# Altium footprint library ICs And Semiconductors SMD.PcbLib: 602 footprints (part 10 of 38)
Each footprint in its own frame and in the unit in brackets; x right, y up, seen from the top. Pads: shape width x height; smd on the part's side, far side on the other; paste and mask are expansions set on the pad; w line width, h text height; cw(c..) or ccw(c..) is an arc to the next point about the centre after c.
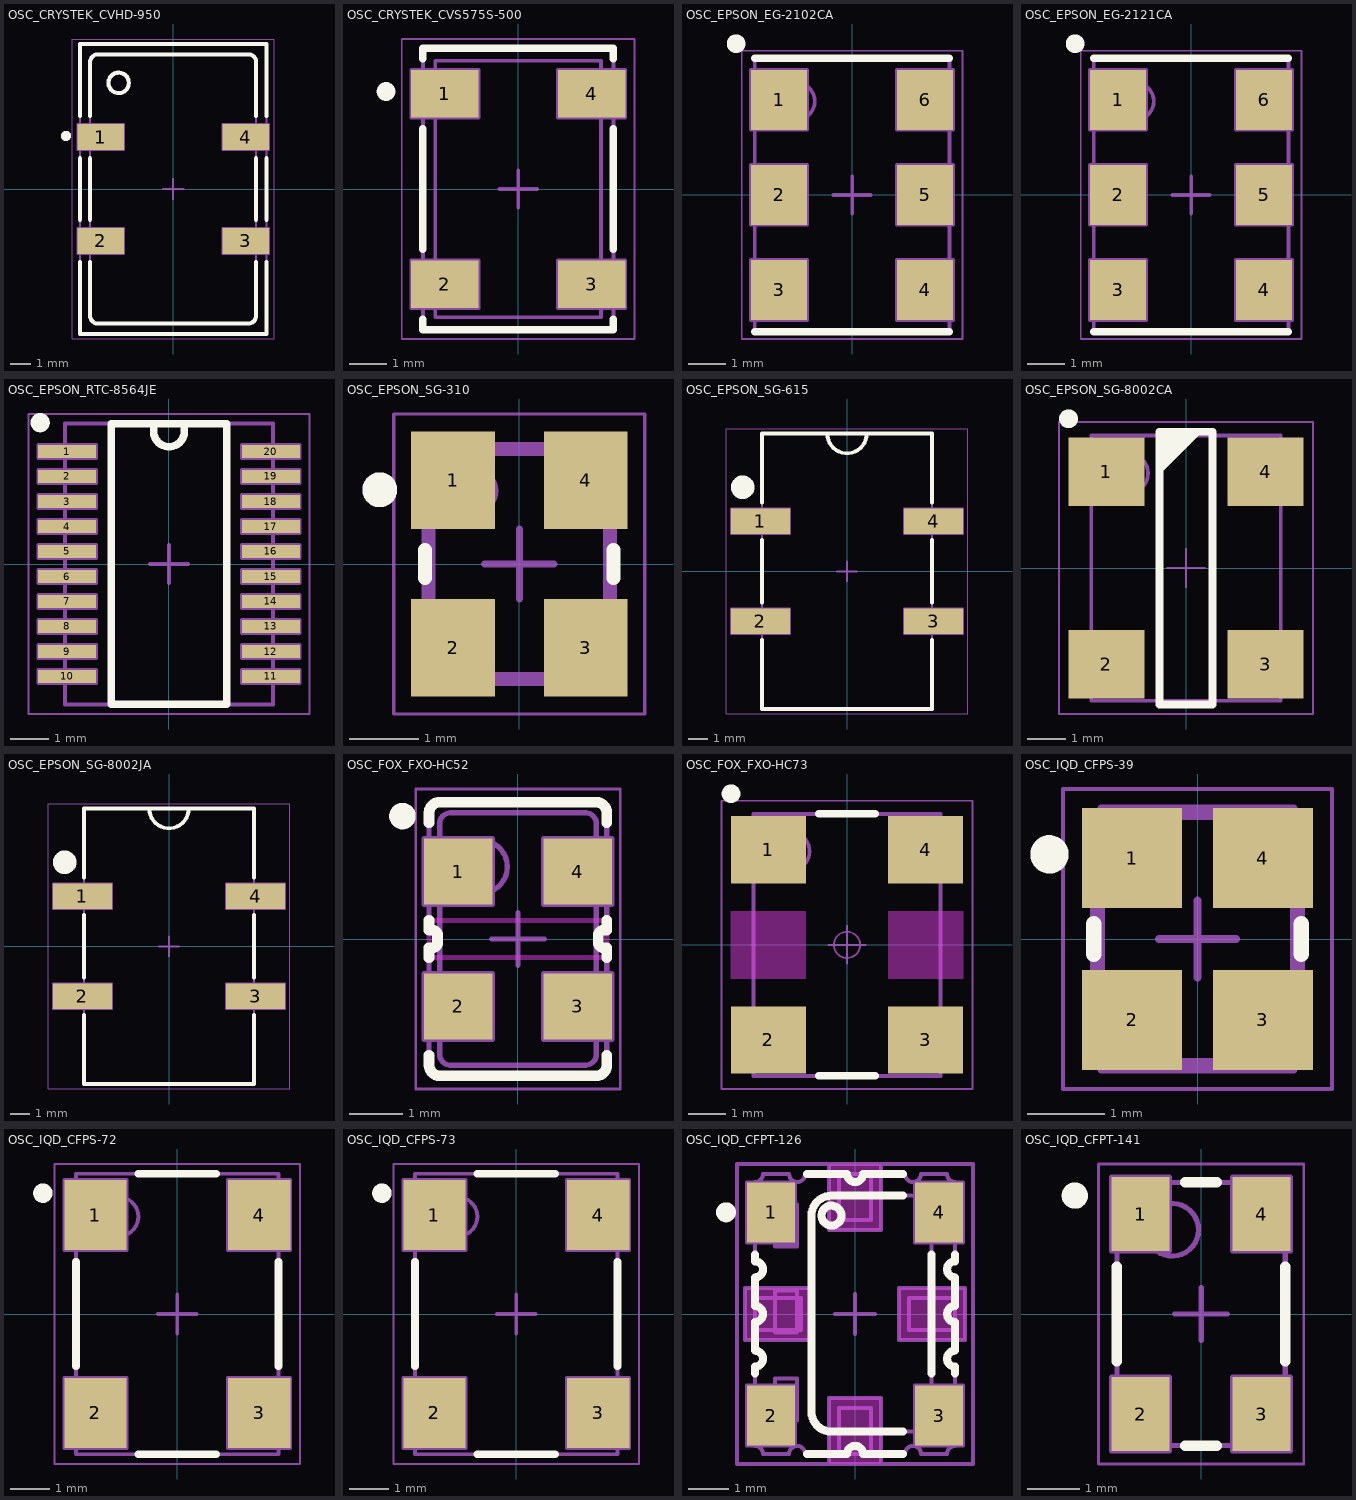
[diagram p9: the footprints below, top view; thin cyan lines are the x and y axes]

## OSC_CRYSTEK_CVHD-950 [mm] "Oscillator, 5.08mm Pitch; 4 Pin, 14.2mm L X 9.14mm W X 5.3mm H, CVHD-950 Serie"
height 5.3
pads (4):
  rect 2.28x1.27 smd: 1(-3.555,2.54) 2(-3.555,-2.54) 3(3.555,-2.54) 4(3.555,2.54)
Top Overlay:
  circle w0.2: c-2.67,5.2 r0.5
  circle w0.25: c-5.25,2.6 r0.125
  lines w0.2: -4.57,-3.575 -4.57,-7.1 4.57,-7.1 4.57,-3.575 ; -4.57,-1.505 -4.57,1.505 ; -4.57,3.575 -4.57,7.1 4.57,7.1 4.57,3.575 ; -4.07,-3.575 -4.07,-6.2 ccw(c-3.67,-6.2) -3.67,-6.6 3.67,-6.6 ccw(c3.67,-6.2) 4.07,-6.2 4.07,-3.575 ; -4.07,-1.505 -4.07,1.505 ; -4.07,3.575 -4.07,6.2 cw(c-3.67,6.2) -3.67,6.6 3.67,6.6 cw(c3.67,6.2) 4.07,6.2 4.07,3.575 ; 4.07,-1.505 4.07,1.505 ; 4.57,-1.505 4.57,1.505
Mechanical 8:
  lines w0.1: -4.055,-2.54 -3.555,-2.54 ; -4.055,2.54 -3.555,2.54 ; -3.555,-3.04 -3.555,-2.54 ; -3.555,-2.04 -3.555,-2.54 ; -3.555,2.04 -3.555,2.54 ; -3.555,3.04 -3.555,2.54 ; -3.055,-2.54 -3.555,-2.54 ; -3.055,2.54 -3.555,2.54 ; -0.5,0 0,0 ; 0,-0.5 0,0 ; 0,0.5 0,0 ; 0.5,0 0,0 ; 3.055,-2.54 3.555,-2.54 ; 3.055,2.54 3.555,2.54 ; 3.555,-3.04 3.555,-2.54 ; 3.555,-2.04 3.555,-2.54 ; 3.555,2.04 3.555,2.54 ; 3.555,3.04 3.555,2.54 ; 4.055,-2.54 3.555,-2.54 ; 4.055,2.54 3.555,2.54 ; -4.695,-3.175 -4.695,-1.905 -2.415,-1.905 -2.415,-3.175 -4.695,-3.175 ; -4.695,1.905 -4.695,3.175 -2.415,3.175 -2.415,1.905 -4.695,1.905 ; 2.415,-3.175 2.415,-1.905 4.695,-1.905 4.695,-3.175 2.415,-3.175 ; 2.415,1.905 2.415,3.175 4.695,3.175 4.695,1.905 2.415,1.905
Mechanical 14:
  circle w0.1: c-2.67,5.2 r0.5
  lines w0.1: -4.57,-3.045 -4.07,-3.045 ; -4.57,-2.035 -4.07,-2.035 ; -4.57,2.035 -4.07,2.035 ; -4.57,3.045 -4.07,3.045 ; 4.07,-3.045 4.57,-3.045 ; 4.07,-2.035 4.57,-2.035 ; 4.07,2.035 4.57,2.035 ; 4.07,3.045 4.57,3.045 ; -4.57,-7.1 4.57,-7.1 4.57,-2.94 cw(c4.57,-2.54) 4.57,-2.14 4.57,2.14 cw(c4.57,2.54) 4.57,2.94 4.57,7.1 -4.57,7.1 -4.57,2.94 cw(c-4.57,2.54) -4.57,2.14 -4.57,-2.14 cw(c-4.57,-2.54) -4.57,-2.94 -4.57,-7.1 ; -4.07,-6.2 ccw(c-3.67,-6.2) -3.67,-6.6 3.67,-6.6 ccw(c3.67,-6.2) 4.07,-6.2 4.07,6.2 ccw(c3.67,6.2) 3.67,6.6 -3.67,6.6 ccw(c-3.67,6.2) -4.07,6.2 -4.07,-6.2
Mechanical 15:
  lines w0.05: -4.945,-7.35 -4.945,7.35 4.945,7.35 4.945,-7.35 -4.945,-7.35
3D body "OSC_CRYSTEK_CVHD-950.stp": height 5.3, standoff 0, extent -4.57,-7.1 4.57,7.1

## OSC_CRYSTEK_CVS575S-500 [mm] "VCO, 5.08mm Pitch; 4 Pin, 5.08mm L X 7.5mm W X 2.5mm H"
height 2.5
pads (4):
  rect 1.8x1.27 smd: 1(-1.955,2.54) 2(-1.955,-2.54) 3(1.955,-2.54) 4(1.955,2.54)
Top Overlay:
  circle w0.25: c-3.525,2.6 r0.125
  lines w0.2: -2.54,-3.475 -2.54,-3.75 2.54,-3.75 2.54,-3.475 ; -2.54,-1.605 -2.54,1.605 ; -2.54,3.475 -2.54,3.75 2.54,3.75 2.54,3.475 ; 2.54,-1.605 2.54,1.605
Mechanical 8:
  lines w0.1: -2.455,-2.54 -1.955,-2.54 ; -2.455,2.54 -1.955,2.54 ; -1.955,-3.04 -1.955,-2.54 ; -1.955,-2.04 -1.955,-2.54 ; -1.955,2.04 -1.955,2.54 ; -1.955,3.04 -1.955,2.54 ; -1.455,-2.54 -1.955,-2.54 ; -1.455,2.54 -1.955,2.54 ; -0.5,0 0,0 ; 0,-0.5 0,0 ; 0,0.5 0,0 ; 0.5,0 0,0 ; 1.455,-2.54 1.955,-2.54 ; 1.455,2.54 1.955,2.54 ; 1.955,-3.04 1.955,-2.54 ; 1.955,-2.04 1.955,-2.54 ; 1.955,2.04 1.955,2.54 ; 1.955,3.04 1.955,2.54 ; 2.455,-2.54 1.955,-2.54 ; 2.455,2.54 1.955,2.54 ; -2.855,-3.175 -2.855,-1.905 -1.055,-1.905 -1.055,-3.175 -2.855,-3.175 ; -2.855,1.905 -2.855,3.175 -1.055,3.175 -1.055,1.905 -2.855,1.905 ; 1.055,-3.175 1.055,-1.905 2.855,-1.905 2.855,-3.175 1.055,-3.175 ; 1.055,1.905 1.055,3.175 2.855,3.175 2.855,1.905 1.055,1.905
Mechanical 14:
  circle w0.1: c-1.555,2.55 r0.4
  lines w0.1: -2.54,-3.75 2.54,-3.75 2.54,3.75 -2.54,3.75 -2.54,-3.75 ; -2.21,-3.42 -2.21,3.42 2.21,3.42 2.21,-3.42 -2.21,-3.42
Mechanical 15:
  lines w0.05: -3.105,-4 3.105,-4 3.105,4 -3.105,4 -3.105,-4
3D body "OSC_CRYSTEK_CVS575S-500.stp": height 2.5, standoff 0, extent -2.54,-3.75 2.54,3.75

## OSC_EPSON_EG-2102CA [mm] "SMD Oscillator, side concave, 6 pins, 5.00x7.00mm"
height 1.4
pads (6):
  rect 1.5x1.6 smd: 1(-1.95,2.54) 2(-1.95,0) 3(-1.95,-2.54) 4(1.95,-2.54) 5(1.95,0) 6(1.95,2.54)
Top Overlay:
  circle w0.25: c-3.1,4.04 r0.125
  lines w0.2: -2.6,-3.65 2.6,-3.65 ; -2.6,3.65 2.6,3.65
Mechanical 8:
  lines w0.1: -2.45,-2.54 -1.95,-2.54 ; -2.45,0 -1.95,0 ; -2.45,2.54 -1.95,2.54 ; -1.95,-3.04 -1.95,-2.54 ; -1.95,-2.04 -1.95,-2.54 ; -1.95,-0.5 -1.95,0 ; -1.95,0.5 -1.95,0 ; -1.95,2.04 -1.95,2.54 ; -1.95,3.04 -1.95,2.54 ; -1.45,-2.54 -1.95,-2.54 ; -1.45,0 -1.95,0 ; -1.45,2.54 -1.95,2.54 ; -0.5,0 0,0 ; 0,-0.5 0,0 ; 0,0.5 0,0 ; 0.5,0 0,0 ; 1.45,-2.54 1.95,-2.54 ; 1.45,0 1.95,0 ; 1.45,2.54 1.95,2.54 ; 1.95,-3.04 1.95,-2.54 ; 1.95,-2.04 1.95,-2.54 ; 1.95,-0.5 1.95,0 ; 1.95,0.5 1.95,0 ; 1.95,2.04 1.95,2.54 ; 1.95,3.04 1.95,2.54 ; 2.45,-2.54 1.95,-2.54 ; 2.45,0 1.95,0 ; 2.45,2.54 1.95,2.54 ; -2.7,-3.34 -1.2,-3.34 -1.2,-1.74 -2.7,-1.74 -2.7,-3.34 ; -2.7,-0.8 -1.2,-0.8 -1.2,0.8 -2.7,0.8 -2.7,-0.8 ; -2.7,1.74 -1.2,1.74 -1.2,3.34 -2.7,3.34 -2.7,1.74 ; 1.2,-3.34 2.7,-3.34 2.7,-1.74 1.2,-1.74 1.2,-3.34 ; 1.2,-0.8 2.7,-0.8 2.7,0.8 1.2,0.8 1.2,-0.8 ; 1.2,1.74 2.7,1.74 2.7,3.34 1.2,3.34 1.2,1.74
Mechanical 14:
  circle w0.1: c-1.5,2.5 r0.5
  lines w0.1: -2.6,-3.6 -2.6,3.6 2.6,3.6 2.6,-3.6 -2.6,-3.6
Mechanical 15:
  lines w0.05: -2.95,-3.85 2.95,-3.85 2.95,3.85 -2.95,3.85 -2.95,-3.85
3D body "OSC_EPSON_EG-2102CA.stp": height 1.4, standoff 0, extent -2.6,-3.6 2.6,3.6

## OSC_EPSON_EG-2121CA [mm] "SMD Oscillator, side concave, 6 pins, 5.00x7.00mm"
height 1.4
pads (6):
  rect 1.5x1.6 smd: 1(-1.95,2.54) 2(-1.95,0) 3(-1.95,-2.54) 4(1.95,-2.54) 5(1.95,0) 6(1.95,2.54)
Top Overlay:
  circle w0.25: c-3.1,4.04 r0.125
  lines w0.2: -2.6,-3.65 2.6,-3.65 ; -2.6,3.65 2.6,3.65
Mechanical 8:
  lines w0.1: -2.45,-2.54 -1.95,-2.54 ; -2.45,0 -1.95,0 ; -2.45,2.54 -1.95,2.54 ; -1.95,-3.04 -1.95,-2.54 ; -1.95,-2.04 -1.95,-2.54 ; -1.95,-0.5 -1.95,0 ; -1.95,0.5 -1.95,0 ; -1.95,2.04 -1.95,2.54 ; -1.95,3.04 -1.95,2.54 ; -1.45,-2.54 -1.95,-2.54 ; -1.45,0 -1.95,0 ; -1.45,2.54 -1.95,2.54 ; -0.5,0 0,0 ; 0,-0.5 0,0 ; 0,0.5 0,0 ; 0.5,0 0,0 ; 1.45,-2.54 1.95,-2.54 ; 1.45,0 1.95,0 ; 1.45,2.54 1.95,2.54 ; 1.95,-3.04 1.95,-2.54 ; 1.95,-2.04 1.95,-2.54 ; 1.95,-0.5 1.95,0 ; 1.95,0.5 1.95,0 ; 1.95,2.04 1.95,2.54 ; 1.95,3.04 1.95,2.54 ; 2.45,-2.54 1.95,-2.54 ; 2.45,0 1.95,0 ; 2.45,2.54 1.95,2.54 ; -2.7,-3.34 -1.2,-3.34 -1.2,-1.74 -2.7,-1.74 -2.7,-3.34 ; -2.7,-0.8 -1.2,-0.8 -1.2,0.8 -2.7,0.8 -2.7,-0.8 ; -2.7,1.74 -1.2,1.74 -1.2,3.34 -2.7,3.34 -2.7,1.74 ; 1.2,-3.34 2.7,-3.34 2.7,-1.74 1.2,-1.74 1.2,-3.34 ; 1.2,-0.8 2.7,-0.8 2.7,0.8 1.2,0.8 1.2,-0.8 ; 1.2,1.74 2.7,1.74 2.7,3.34 1.2,3.34 1.2,1.74
Mechanical 14:
  circle w0.1: c-1.5,2.5 r0.5
  lines w0.1: -2.6,-3.6 -2.6,3.6 2.6,3.6 2.6,-3.6 -2.6,-3.6
Mechanical 15:
  lines w0.05: -2.95,-3.85 2.95,-3.85 2.95,3.85 -2.95,3.85 -2.95,-3.85
3D body "OSC_EPSON_EG-2121CA.stp": height 1.4, standoff 0, extent -2.6,-3.6 2.6,3.6

## OSC_EPSON_RTC-8564JE [mm] "VSOJ, 0.65mm Pitch, 20 Pin, 7.00mm L X 5.4mm W X 1.5mm H Body"
height 1.5
pads (20):
  rect 1.5x0.35 smd: 1(-2.65,2.925) 2(-2.65,2.275) 3(-2.65,1.625) 4(-2.65,0.975) 5(-2.65,0.325) 6(-2.65,-0.325) 7(-2.65,-0.975) 8(-2.65,-1.625) 9(-2.65,-2.275) 10(-2.65,-2.925) 11(2.65,-2.925) 12(2.65,-2.275) 13(2.65,-1.625) 14(2.65,-0.975) 15(2.65,-0.325) 16(2.65,0.325) 17(2.65,0.975) 18(2.65,1.625) 19(2.65,2.275) 20(2.65,2.925)
Top Overlay:
  circle w0.25: c-3.35,3.675 r0.125
  lines w0.2: -0.4,3.65 -0.4,3.45 ccw(c0,3.45) 0.4,3.45 0.4,3.65 ; -1.5,-3.65 1.5,-3.65 1.5,3.65 -1.5,3.65 -1.5,-3.65
Mechanical 8:
  lines w0.1: -0.5,0 0,0 ; 0,-0.5 0,0 ; 0,0.5 0,0 ; 0.5,0 0,0 ; -3.4,-3.1 -1.9,-3.1 -1.9,-2.75 -3.4,-2.75 ; -3.4,-3.1 -3.4,-2.75 ; -3.4,-3.1 -2.65,-2.925 -3.4,-2.75 ; -3.4,-2.45 -1.9,-2.45 -1.9,-2.1 -3.4,-2.1 ; -3.4,-2.45 -3.4,-2.1 ; -3.4,-2.45 -2.65,-2.275 -3.4,-2.1 ; -3.4,-1.8 -1.9,-1.8 -1.9,-1.45 -3.4,-1.45 ; -3.4,-1.8 -3.4,-1.45 ; -3.4,-1.8 -2.65,-1.625 -3.4,-1.45 ; -3.4,-1.15 -1.9,-1.15 -1.9,-0.8 -3.4,-0.8 ; -3.4,-1.15 -3.4,-0.8 ; -3.4,-1.15 -2.65,-0.975 -3.4,-0.8 ; -3.4,-0.5 -1.9,-0.5 -1.9,-0.15 -3.4,-0.15 ; -3.4,-0.5 -3.4,-0.15 ; -3.4,-0.5 -2.65,-0.325 -3.4,-0.15 ; -3.4,0.15 -1.9,0.15 -1.9,0.5 -3.4,0.5 ; -3.4,0.15 -3.4,0.5 ; -3.4,0.15 -2.65,0.325 -3.4,0.5 ; -3.4,0.8 -1.9,0.8 -1.9,1.15 -3.4,1.15 ; -3.4,0.8 -3.4,1.15 ; -3.4,0.8 -2.65,0.975 -3.4,1.15 ; -3.4,1.45 -1.9,1.45 -1.9,1.8 -3.4,1.8 ; -3.4,1.45 -3.4,1.8 ; -3.4,1.45 -2.65,1.625 -3.4,1.8 ; -3.4,2.1 -1.9,2.1 -1.9,2.45 -3.4,2.45 ; -3.4,2.1 -3.4,2.45 ; -3.4,2.1 -2.65,2.275 -3.4,2.45 ; -3.4,2.75 -1.9,2.75 -1.9,3.1 -3.4,3.1 ; -3.4,2.75 -3.4,3.1 ; -3.4,2.75 -2.65,2.925 -3.4,3.1 ; 3.4,-3.1 1.9,-3.1 1.9,-2.75 3.4,-2.75 ; 3.4,-3.1 3.4,-2.75 ; 3.4,-3.1 2.65,-2.925 3.4,-2.75 ; 3.4,-2.45 1.9,-2.45 1.9,-2.1 3.4,-2.1 ; 3.4,-2.45 3.4,-2.1 ; 3.4,-2.45 2.65,-2.275 3.4,-2.1 ; 3.4,-1.8 1.9,-1.8 1.9,-1.45 3.4,-1.45 ; 3.4,-1.8 3.4,-1.45 ; 3.4,-1.8 2.65,-1.625 3.4,-1.45 ; 3.4,-1.15 1.9,-1.15 1.9,-0.8 3.4,-0.8 ; 3.4,-1.15 3.4,-0.8 ; 3.4,-1.15 2.65,-0.975 3.4,-0.8 ; 3.4,-0.5 1.9,-0.5 1.9,-0.15 3.4,-0.15 ; 3.4,-0.5 3.4,-0.15 ; 3.4,-0.5 2.65,-0.325 3.4,-0.15 ; 3.4,0.15 1.9,0.15 1.9,0.5 3.4,0.5 ; 3.4,0.15 3.4,0.5 ; 3.4,0.15 2.65,0.325 3.4,0.5 ; 3.4,0.8 1.9,0.8 1.9,1.15 3.4,1.15 ; 3.4,0.8 3.4,1.15 ; 3.4,0.8 2.65,0.975 3.4,1.15 ; 3.4,1.45 1.9,1.45 1.9,1.8 3.4,1.8 ; 3.4,1.45 3.4,1.8 ; 3.4,1.45 2.65,1.625 3.4,1.8 ; 3.4,2.1 1.9,2.1 1.9,2.45 3.4,2.45 ; 3.4,2.1 3.4,2.45 ; 3.4,2.1 2.65,2.275 3.4,2.45 ; 3.4,2.75 1.9,2.75 1.9,3.1 3.4,3.1 ; 3.4,2.75 3.4,3.1 ; 3.4,2.75 2.65,2.925 3.4,3.1
Mechanical 14:
  lines w0.1: -0.4,3.65 -0.4,3.45 ccw(c0,3.45) 0.4,3.45 0.4,3.65 ; -2.7,-3.65 -2.7,3.65 2.7,3.65 2.7,-3.65 -2.7,-3.65
Mechanical 15:
  lines w0.05: -3.65,-3.9 3.65,-3.9 3.65,3.9 -3.65,3.9 -3.65,-3.9
3D body "OSC_EPSON_RTC-8564JE.stp": height 1.5, standoff 0, extent -3,-3.5 3,3.5

## OSC_EPSON_SG-310 [mm] "Oscillator, Corner Concave; 4 pin, 3.2mm L X 2.5mm W X 1.2mm H"
height 1.2
pads (4):
  rect 1.2x1.4 smd: 1(-0.95,1.2) 2(-0.95,-1.2) 3(0.95,-1.2) 4(0.95,1.2)
Top Overlay:
  circle w0.25: c-2,1.063 r0.125
  lines w0.2: -1.35,-0.2 -1.35,0.2 ; 1.35,-0.2 1.35,0.2
Mechanical 8:
  lines w0.1: -1.45,-1.2 -0.95,-1.2 ; -1.45,1.2 -0.95,1.2 ; -0.95,-1.7 -0.95,-1.2 ; -0.95,-0.7 -0.95,-1.2 ; -0.95,0.7 -0.95,1.2 ; -0.95,1.7 -0.95,1.2 ; -0.5,0 0,0 ; -0.45,-1.2 -0.95,-1.2 ; -0.45,1.2 -0.95,1.2 ; 0,-0.5 0,0 ; 0,0.5 0,0 ; 0.45,-1.2 0.95,-1.2 ; 0.45,1.2 0.95,1.2 ; 0.5,0 0,0 ; 0.95,-1.7 0.95,-1.2 ; 0.95,-0.7 0.95,-1.2 ; 0.95,0.7 0.95,1.2 ; 0.95,1.7 0.95,1.2 ; 1.45,-1.2 0.95,-1.2 ; 1.45,1.2 0.95,1.2
Mechanical 14:
  circle w0.1: c-0.65,1.05 r0.3
  lines w0.1: -1.35,-1.5 ccw(c-1.15,-1.5) -1.15,-1.7 1.15,-1.7 ccw(c1.15,-1.5) 1.35,-1.5 1.35,1.5 ccw(c1.15,1.5) 1.15,1.7 -1.15,1.7 ccw(c-1.15,1.5) -1.35,1.5 -1.35,-1.5 ; -1.25,-1.4 ccw(c-1.05,-1.4) -1.05,-1.6 1.05,-1.6 ccw(c1.05,-1.4) 1.25,-1.4 1.25,1.4 ccw(c1.05,1.4) 1.05,1.6 -1.05,1.6 ccw(c-1.05,1.4) -1.25,1.4 -1.25,-1.4
Mechanical 15:
  lines w0.05: -1.8,-2.15 1.8,-2.15 1.8,2.15 -1.8,2.15 -1.8,-2.15
3D body "OSC_EPSON_SG-310.stp": height 1.2, standoff 0, extent -1.25,-1.65 1.25,1.65

## OSC_EPSON_SG-615 [mm] "Oscillator, J-lead; 5.08mm pitch; 4 pin, 14mm L X 8.65mm W X 4.70mm H"
height 4.7
pads (4):
  rect 3x1.3 smd: 1(-4.4,2.54) 2(-4.4,-2.54) 3(4.4,-2.54) 4(4.4,2.54)
Top Overlay:
  circle w0.6: c-5.3,4.275 r0.3
  lines w0.2: -4.325,-3.49 -4.325,-7 4.325,-7 4.325,-3.49 ; -4.325,-1.59 -4.325,1.59 ; -4.325,3.49 -4.325,7 4.325,7 4.325,3.49 ; -1,7 ccw(c0,7) 1,7 ; 4.325,-1.59 4.325,1.59
Mechanical 8:
  lines w0.1: -4.9,-2.54 -4.4,-2.54 ; -4.9,2.54 -4.4,2.54 ; -4.4,-3.04 -4.4,-2.54 ; -4.4,-2.04 -4.4,-2.54 ; -4.4,2.04 -4.4,2.54 ; -4.4,3.04 -4.4,2.54 ; -3.9,-2.54 -4.4,-2.54 ; -3.9,2.54 -4.4,2.54 ; -0.5,0 0,0 ; 0,-0.5 0,0 ; 0,0.5 0,0 ; 0.5,0 0,0 ; 3.9,-2.54 4.4,-2.54 ; 3.9,2.54 4.4,2.54 ; 4.4,-3.04 4.4,-2.54 ; 4.4,-2.04 4.4,-2.54 ; 4.4,2.04 4.4,2.54 ; 4.4,3.04 4.4,2.54 ; 4.9,-2.54 4.4,-2.54 ; 4.9,2.54 4.4,2.54 ; -5.9,-3.19 -5.9,-1.89 -2.9,-1.89 -2.9,-3.19 -5.9,-3.19 ; -5.9,1.89 -5.9,3.19 -2.9,3.19 -2.9,1.89 -5.9,1.89 ; 2.9,-3.19 2.9,-1.89 5.9,-1.89 5.9,-3.19 2.9,-3.19 ; 2.9,1.89 2.9,3.19 5.9,3.19 5.9,1.89 2.9,1.89
Mechanical 14:
  lines w0.1: -1,7 ccw(c0,7) 1,7 ; -4.325,-7 4.325,-7 4.325,7 -4.325,7 -4.325,-7
Mechanical 15:
  lines w0.05: -6.15,-7.25 -6.15,7.25 6.15,7.25 6.15,-7.25 -6.15,-7.25
3D body "OSC_EPSON_SG-615.stp": height 4.7, standoff 0, extent -4.91,-7 4.91,7

## OSC_EPSON_SG-8002CA [mm] "SMD Oscillator, Side Convave, 4 pins, 5.00x7.00mm SG-8002CA Serie"
height 1.5
pads (4):
  rect 2x1.8 smd: 1(-2.1,2.54) 2(-2.1,-2.54) 3(2.1,-2.54) 4(2.1,2.54)
Top Overlay:
  circle w0.25: c-3.1,3.94 r0.125
  lines w0.2: -0.7,2.6 0.3,3.6 ; -0.7,2.8 0.1,3.6 ; -0.7,3 -0.1,3.6 ; -0.7,3.2 -0.3,3.6 ; -0.7,3.4 -0.5,3.6 ; -0.7,-3.6 -0.7,3.6 0.7,3.6 0.7,-3.6 -0.7,-3.6
Mechanical 14:
  circle w0.1: c-1.5,2.5 r0.5
  lines w0.1: -2.5,-3.5 2.5,-3.5 2.5,3.5 -2.5,3.5 -2.5,-3.5
Mechanical 15:
  lines w0.05: -0.5,0 0.5,0 ; 0,-0.5 0,0.5 ; -3.35,-3.85 3.35,-3.85 3.35,3.85 -3.35,3.85 -3.35,-3.85
3D body "OSC_EPSON_SG-8002CA.stp": height 1.5, standoff 0, extent -2.6,-3.6 2.6,3.6

## OSC_EPSON_SG-8002JA [mm] "Oscillator, J-lead; 5.08mm pitch; 4 pin, 14mm L X 8.65mm W X 4.70mm H, EPSON SG-8002JA Series"
height 4.7
pads (4):
  rect 3x1.3 smd: 1(-4.4,2.54) 2(-4.4,-2.54) 3(4.4,-2.54) 4(4.4,2.54)
Top Overlay:
  circle w0.6: c-5.3,4.275 r0.3
  lines w0.2: -4.325,-3.49 -4.325,-7 4.325,-7 4.325,-3.49 ; -4.325,-1.59 -4.325,1.59 ; -4.325,3.49 -4.325,7 4.325,7 4.325,3.49 ; -1,7 ccw(c0,7) 1,7 ; 4.325,-1.59 4.325,1.59
Mechanical 8:
  lines w0.1: -4.9,-2.54 -4.4,-2.54 ; -4.9,2.54 -4.4,2.54 ; -4.4,-3.04 -4.4,-2.54 ; -4.4,-2.04 -4.4,-2.54 ; -4.4,2.04 -4.4,2.54 ; -4.4,3.04 -4.4,2.54 ; -3.9,-2.54 -4.4,-2.54 ; -3.9,2.54 -4.4,2.54 ; -0.5,0 0,0 ; 0,-0.5 0,0 ; 0,0.5 0,0 ; 0.5,0 0,0 ; 3.9,-2.54 4.4,-2.54 ; 3.9,2.54 4.4,2.54 ; 4.4,-3.04 4.4,-2.54 ; 4.4,-2.04 4.4,-2.54 ; 4.4,2.04 4.4,2.54 ; 4.4,3.04 4.4,2.54 ; 4.9,-2.54 4.4,-2.54 ; 4.9,2.54 4.4,2.54 ; -5.9,-3.19 -5.9,-1.89 -2.9,-1.89 -2.9,-3.19 -5.9,-3.19 ; -5.9,1.89 -5.9,3.19 -2.9,3.19 -2.9,1.89 -5.9,1.89 ; 2.9,-3.19 2.9,-1.89 5.9,-1.89 5.9,-3.19 2.9,-3.19 ; 2.9,1.89 2.9,3.19 5.9,3.19 5.9,1.89 2.9,1.89
Mechanical 14:
  lines w0.1: -1,7 ccw(c0,7) 1,7 ; -4.325,-7 4.325,-7 4.325,7 -4.325,7 -4.325,-7
Mechanical 15:
  lines w0.05: -6.15,-7.25 -6.15,7.25 6.15,7.25 6.15,-7.25 -6.15,-7.25
3D body "OSC_EPSON_SG-8002JA.stp": height 4.7, standoff 0, extent -4.91,-7 4.91,7

## OSC_FOX_FXO-HC52 [mm] "SMD Oscillator, Side Convave, 4 pins, 5x3.2mm FXO-HC52 Series"
height 1.4
pads (4):
  rect 1.29x1.24 smd: 1(-1.125,1.27) 2(-1.125,-1.27) 3(1.125,-1.27) 4(1.125,1.27)
Top Layer keep-out:
  lines w0.1: -1.675,-0.35 1.675,-0.35 1.675,0.35 -1.675,0.35 -1.675,-0.35
Top Overlay:
  circle w0.25: c-2.175,2.315 r0.125
  lines w0.2: -1.675,-2.19 -1.675,-2.375 ccw(c-1.475,-2.375) -1.475,-2.575 1.475,-2.575 ccw(c1.475,-2.375) 1.675,-2.375 1.675,-2.19 ; -1.675,-0.35 -1.675,-0.165 -1.615,-0.165 ccw(c-1.615,-0.06) -1.515,-0.092 -1.515,0.092 ccw(c-1.615,0.06) -1.615,0.165 -1.675,0.165 -1.675,0.35 ; -1.675,2.19 -1.675,2.375 cw(c-1.475,2.375) -1.475,2.575 1.475,2.575 cw(c1.475,2.375) 1.675,2.375 1.675,2.19 ; 1.675,-0.35 1.675,-0.165 1.615,-0.165 cw(c1.615,-0.06) 1.515,-0.092 1.515,0.092 cw(c1.615,0.06) 1.615,0.165 1.675,0.165 1.675,0.35
Mechanical 8:
  lines w0.1: -1.625,-1.27 -1.125,-1.27 ; -1.625,1.27 -1.125,1.27 ; -1.125,-1.77 -1.125,-1.27 ; -1.125,-0.77 -1.125,-1.27 ; -1.125,0.77 -1.125,1.27 ; -1.125,1.77 -1.125,1.27 ; -0.625,-1.27 -1.125,-1.27 ; -0.625,1.27 -1.125,1.27 ; -0.5,0 0,0 ; 0,-0.5 0,0 ; 0,0.5 0,0 ; 0.5,0 0,0 ; 0.625,-1.27 1.125,-1.27 ; 0.625,1.27 1.125,1.27 ; 1.125,-1.77 1.125,-1.27 ; 1.125,-0.77 1.125,-1.27 ; 1.125,0.77 1.125,1.27 ; 1.125,1.77 1.125,1.27 ; 1.625,-1.27 1.125,-1.27 ; 1.625,1.27 1.125,1.27 ; -1.77,-1.89 -1.77,-0.65 -0.48,-0.65 -0.48,-1.89 -1.77,-1.89 ; -1.77,0.65 -1.77,1.89 -0.48,1.89 -0.48,0.65 -1.77,0.65 ; 0.48,-1.89 0.48,-0.65 1.77,-0.65 1.77,-1.89 0.48,-1.89 ; 0.48,0.65 0.48,1.89 1.77,1.89 1.77,0.65 0.48,0.65
Mechanical 14:
  circle w0.1: c-0.7,1.36 r0.5
  lines w0.1: -1.675,-2.375 ccw(c-1.475,-2.375) -1.475,-2.575 1.475,-2.575 ccw(c1.475,-2.375) 1.675,-2.375 1.675,-1.435 1.615,-1.435 cw(c1.615,-1.33) 1.515,-1.362 1.515,-1.178 cw(c1.615,-1.21) 1.615,-1.105 1.675,-1.105 1.675,-0.165 1.615,-0.165 cw(c1.615,-0.06) 1.515,-0.092 1.515,0.092 cw(c1.615,0.06) 1.615,0.165 1.675,0.165 1.675,1.105 1.615,1.105 cw(c1.615,1.21) 1.515,1.178 1.515,1.362 cw(c1.615,1.33) 1.615,1.435 1.675,1.435 1.675,2.375 ccw(c1.475,2.375) 1.475,2.575 -1.475,2.575 ccw(c-1.475,2.375) -1.675,2.375 -1.675,1.435 -1.615,1.435 cw(c-1.615,1.33) -1.515,1.362 -1.515,1.178 cw(c-1.615,1.21) -1.615,1.105 -1.675,1.105 -1.675,0.165 -1.615,0.165 cw(c-1.615,0.06) -1.515,0.092 -1.515,-0.092 cw(c-1.615,-0.06) -1.615,-0.165 -1.675,-0.165 -1.675,-1.105 -1.615,-1.105 cw(c-1.615,-1.21) -1.515,-1.178 -1.515,-1.362 cw(c-1.615,-1.33) -1.615,-1.435 -1.675,-1.435 -1.675,-2.375 ; -1.475,-2.175 ccw(c-1.275,-2.175) -1.275,-2.375 1.275,-2.375 ccw(c1.275,-2.175) 1.475,-2.175 1.475,2.175 ccw(c1.275,2.175) 1.275,2.375 -1.275,2.375 ccw(c-1.275,2.175) -1.475,2.175 -1.475,-2.175
Mechanical 15:
  lines w0.05: -1.925,-2.825 1.925,-2.825 1.925,2.825 -1.925,2.825 -1.925,-2.825
3D body "OSC_FOX_FXO-HC52.stp": height 1.4, standoff 0, extent -1.675,-2.575 1.675,2.575

## OSC_FOX_FXO-HC73 [mm] "SMD Oscillator, Side Convave, 6 Pins, 5.00x7.00mm FXO-HC73 Serie"
height 1.4
pads (4):
  rect 2x1.8 smd: 1(-2.1,2.54) 2(-2.1,-2.54) 3(2.1,-2.54) 4(2.1,2.54)
Top Layer keep-out:
  region: 1.1,0.9 3.1,0.9 3.1,-0.9 1.1,-0.9
  region: -3.1,0.9 -1.1,0.9 -1.1,-0.9 -3.1,-0.9
Top Overlay:
  circle w0.25: c-3.1,4.04 r0.125
  lines w0.2: -0.75,-3.5 0.75,-3.5 ; -0.75,3.5 0.75,3.5
Mechanical 14:
  circle w0.1: c-1.5,2.5 r0.5
  lines w0.1: -2.5,-3.5 -2.5,3.5 2.5,3.5 2.5,-3.5 -2.5,-3.5
Mechanical 15:
  circle w0.05: c0,0 r0.35
  lines w0.05: -0.5,0 0.5,0 ; 0,-0.5 0,0.5 ; -3.35,-3.85 -3.35,3.85 3.35,3.85 3.35,-3.85 -3.35,-3.85
3D body "OSC_FOX_FXO-HC73.stp": height 1.4, standoff 0, extent -2.6,-3.6 2.6,3.6

## OSC_IQD_CFPS-39 [mm] "Oscillator, Side Concave, 2.20mm Pitch; 4 Pin, 2.50mm L X 3.20mm W X 1.30mm H"
height 1.3
pads (4):
  rect 1.3x1.3 smd: 1(-0.85,1.05) 2(-0.85,-1.05) 3(0.85,-1.05) 4(0.85,1.05)
Top Overlay:
  circle w0.25: c-1.925,1.1 r0.125
  lines w0.2: -1.35,-0.2 -1.35,0.2 ; 1.35,-0.2 1.35,0.2
Mechanical 8:
  lines w0.1: -1.35,-1.05 -0.85,-1.05 ; -1.35,1.05 -0.85,1.05 ; -0.85,-1.55 -0.85,-1.05 ; -0.85,-0.55 -0.85,-1.05 ; -0.85,0.55 -0.85,1.05 ; -0.85,1.55 -0.85,1.05 ; -0.5,0 0,0 ; -0.35,-1.05 -0.85,-1.05 ; -0.35,1.05 -0.85,1.05 ; 0,-0.5 0,0 ; 0,0.5 0,0 ; 0.35,-1.05 0.85,-1.05 ; 0.35,1.05 0.85,1.05 ; 0.5,0 0,0 ; 0.85,-1.55 0.85,-1.05 ; 0.85,-0.55 0.85,-1.05 ; 0.85,0.55 0.85,1.05 ; 0.85,1.55 0.85,1.05 ; 1.35,-1.05 0.85,-1.05 ; 1.35,1.05 0.85,1.05
Mechanical 14:
  circle w0.1: c-0.65,1.05 r0.3
  lines w0.1: -1.35,-1.6 cw(c-1.35,-1.7) -1.25,-1.7 1.25,-1.7 cw(c1.35,-1.7) 1.35,-1.6 1.35,1.6 cw(c1.35,1.7) 1.25,1.7 -1.25,1.7 cw(c-1.35,1.7) -1.35,1.6 -1.35,-1.6 ; -1.25,-1.4 ccw(c-1.05,-1.4) -1.05,-1.6 1.05,-1.6 ccw(c1.05,-1.4) 1.25,-1.4 1.25,1.4 ccw(c1.05,1.4) 1.05,1.6 -1.05,1.6 ccw(c-1.05,1.4) -1.25,1.4 -1.25,-1.4
Mechanical 15:
  lines w0.05: -1.75,-1.95 1.75,-1.95 1.75,1.95 -1.75,1.95 -1.75,-1.95
3D body "OSC_IQD_CFPS-39.stp": height 1.3, standoff 0, extent -1.35,-1.7 1.35,1.7

## OSC_IQD_CFPS-72 [mm] "Oscillator, Side Concave; 5.08mm Pitch; 4 Pin, 5.00mm L X 7.00mm W X 1.40mm H, CFPS-72 Serie"
height 1.4
pads (4):
  rect 1.6x1.8 smd: 1(-2.1,2.54) 2(-2.1,-2.54) 3(2.1,-2.54) 4(2.1,2.54)
Top Overlay:
  circle w0.25: c-3.45,3.1 r0.125
  lines w0.2: -2.6,-1.34 -2.6,1.34 ; -1,-3.6 1,-3.6 ; -1,3.6 1,3.6 ; 2.6,-1.34 2.6,1.34
Mechanical 8:
  lines w0.1: -2.6,-2.54 -2.1,-2.54 ; -2.6,2.54 -2.1,2.54 ; -2.1,-3.04 -2.1,-2.54 ; -2.1,-2.04 -2.1,-2.54 ; -2.1,2.04 -2.1,2.54 ; -2.1,3.04 -2.1,2.54 ; -1.6,-2.54 -2.1,-2.54 ; -1.6,2.54 -2.1,2.54 ; -0.5,0 0,0 ; 0,-0.5 0,0 ; 0,0.5 0,0 ; 0.5,0 0,0 ; 1.6,-2.54 2.1,-2.54 ; 1.6,2.54 2.1,2.54 ; 2.1,-3.04 2.1,-2.54 ; 2.1,-2.04 2.1,-2.54 ; 2.1,2.04 2.1,2.54 ; 2.1,3.04 2.1,2.54 ; 2.6,-2.54 2.1,-2.54 ; 2.6,2.54 2.1,2.54 ; -2.9,-3.44 -1.3,-3.44 -1.3,-1.64 -2.9,-1.64 -2.9,-3.44 ; -2.9,1.64 -1.3,1.64 -1.3,3.44 -2.9,3.44 -2.9,1.64 ; 1.3,-3.44 2.9,-3.44 2.9,-1.64 1.3,-1.64 1.3,-3.44 ; 1.3,1.64 2.9,1.64 2.9,3.44 1.3,3.44 1.3,1.64
Mechanical 14:
  circle w0.1: c-1.5,2.5 r0.5
  lines w0.1: -2.6,-3.6 2.6,-3.6 2.6,3.6 -2.6,3.6 -2.6,-3.6
Mechanical 15:
  lines w0.05: -3.15,-3.85 -3.15,3.85 3.15,3.85 3.15,-3.85 -3.15,-3.85
3D body "OSC_IQD_CFPS-72.stp": height 1.4, standoff 0, extent -2.6,-3.6 2.6,3.6

## OSC_IQD_CFPS-73 [mm] "Oscillator, Side Concave; 5.08mm Pitch; 4 Pin, 5.00mm L X 7.00mm W X 1.40mm H, CFPS-73 Serie"
height 1.4
pads (4):
  rect 1.6x1.8 smd: 1(-2.1,2.54) 2(-2.1,-2.54) 3(2.1,-2.54) 4(2.1,2.54)
Top Overlay:
  circle w0.25: c-3.45,3.1 r0.125
  lines w0.2: -2.6,-1.34 -2.6,1.34 ; -1,-3.6 1,-3.6 ; -1,3.6 1,3.6 ; 2.6,-1.34 2.6,1.34
Mechanical 8:
  lines w0.1: -2.6,-2.54 -2.1,-2.54 ; -2.6,2.54 -2.1,2.54 ; -2.1,-3.04 -2.1,-2.54 ; -2.1,-2.04 -2.1,-2.54 ; -2.1,2.04 -2.1,2.54 ; -2.1,3.04 -2.1,2.54 ; -1.6,-2.54 -2.1,-2.54 ; -1.6,2.54 -2.1,2.54 ; -0.5,0 0,0 ; 0,-0.5 0,0 ; 0,0.5 0,0 ; 0.5,0 0,0 ; 1.6,-2.54 2.1,-2.54 ; 1.6,2.54 2.1,2.54 ; 2.1,-3.04 2.1,-2.54 ; 2.1,-2.04 2.1,-2.54 ; 2.1,2.04 2.1,2.54 ; 2.1,3.04 2.1,2.54 ; 2.6,-2.54 2.1,-2.54 ; 2.6,2.54 2.1,2.54 ; -2.9,-3.44 -1.3,-3.44 -1.3,-1.64 -2.9,-1.64 -2.9,-3.44 ; -2.9,1.64 -1.3,1.64 -1.3,3.44 -2.9,3.44 -2.9,1.64 ; 1.3,-3.44 2.9,-3.44 2.9,-1.64 1.3,-1.64 1.3,-3.44 ; 1.3,1.64 2.9,1.64 2.9,3.44 1.3,3.44 1.3,1.64
Mechanical 14:
  circle w0.1: c-1.5,2.5 r0.5
  lines w0.1: -2.6,-3.6 2.6,-3.6 2.6,3.6 -2.6,3.6 -2.6,-3.6
Mechanical 15:
  lines w0.05: -3.15,-3.85 -3.15,3.85 3.15,3.85 3.15,-3.85 -3.15,-3.85
3D body "OSC_IQD_CFPS-73.stp": height 1.4, standoff 0, extent -2.6,-3.6 2.6,3.6

## OSC_IQD_CFPT-126 [mm] "SMD Oscillator, Side Convave, 4 pins, 5.00x7.00mm"
height 2
pads (4):
  rect 1.2x1.5 smd: 1(-2.1,2.54) 2(-2.1,-2.54) 3(2.1,-2.54) 4(2.1,2.54)
Top Layer keep-out:
  region: -0.645,3.75 -0.645,2.1 0.645,2.1 0.645,3.75
  region: -0.645,-2.1 -0.645,-3.75 0.645,-3.75 0.645,-2.1
  region: -2.75,-0.645 -1.1,-0.645 -1.1,0.645 -2.75,0.645
  region: 1.1,-0.645 2.75,-0.645 2.75,0.645 1.1,0.645
Top Overlay:
  circle w0.25: c-3.227,2.543 r0.125
  circle w0.2: c-0.589,2.459 r0.25
  lines w0.2: -2.5,-1.49 -2.5,-1.318 ccw(c-2.5,-1.118) -2.5,-0.918 -2.5,-0.2 ccw(c-2.5,0) -2.5,0.2 -2.5,0.918 ccw(c-2.5,1.118) -2.5,1.318 -2.5,1.49 ; -1.2,-3.5 -0.2,-3.5 cw(c0,-3.5) 0.2,-3.5 1.2,-3.5 ; -1.2,3.5 -0.2,3.5 ccw(c0,3.5) 0.2,3.5 1.2,3.5 ; 1.2,-2.941 -0.589,-2.941 cw(c-0.589,-2.441) -1.089,-2.441 -1.089,2.459 cw(c-0.589,2.459) -0.589,2.959 1.2,2.959 ; 1.914,-1.49 1.914,1.49 ; 2.5,-1.49 2.5,-1.318 cw(c2.5,-1.118) 2.5,-0.918 2.5,-0.2 cw(c2.5,0) 2.5,0.2 2.5,0.918 cw(c2.5,1.118) 2.5,1.318 2.5,1.49
Mechanical 8:
  lines w0.1: -2.6,-2.54 -2.1,-2.54 ; -2.6,2.54 -2.1,2.54 ; -2.1,-3.04 -2.1,-2.54 ; -2.1,-2.04 -2.1,-2.54 ; -2.1,2.04 -2.1,2.54 ; -2.1,3.04 -2.1,2.54 ; -1.6,-2.54 -2.1,-2.54 ; -1.6,2.54 -2.1,2.54 ; -0.5,0 0,0 ; 0,-0.5 0,0 ; 0,0.5 0,0 ; 0.5,0 0,0 ; 1.6,-2.54 2.1,-2.54 ; 1.6,2.54 2.1,2.54 ; 2.1,-3.04 2.1,-2.54 ; 2.1,-2.04 2.1,-2.54 ; 2.1,2.04 2.1,2.54 ; 2.1,3.04 2.1,2.54 ; 2.6,-2.54 2.1,-2.54 ; 2.6,2.54 2.1,2.54 ; -2.75,-0.645 -2.75,0.645 -1.1,0.645 -1.1,-0.645 -2.75,-0.645 ; -2.7,-3.29 -1.5,-3.29 -1.5,-1.79 -2.7,-1.79 -2.7,-3.29 ; -2.7,1.79 -1.5,1.79 -1.5,3.29 -2.7,3.29 -2.7,1.79 ; -2.5,-0.395 -2.5,0.395 -1.35,0.395 -1.35,-0.395 -2.5,-0.395 ; -0.645,-3.75 -0.645,-2.1 0.645,-2.1 0.645,-3.75 -0.645,-3.75 ; -0.645,2.1 -0.645,3.75 0.645,3.75 0.645,2.1 -0.645,2.1 ; -0.395,-3.5 -0.395,-2.35 0.395,-2.35 0.395,-3.5 -0.395,-3.5 ; -0.395,2.35 -0.395,3.5 0.395,3.5 0.395,2.35 -0.395,2.35 ; 1.1,-0.645 1.1,0.645 2.75,0.645 2.75,-0.645 1.1,-0.645 ; 1.35,-0.395 1.35,0.395 2.5,0.395 2.5,-0.395 1.35,-0.395 ; 1.5,-3.29 2.7,-3.29 2.7,-1.79 1.5,-1.79 1.5,-3.29 ; 1.5,1.79 2.7,1.79 2.7,3.29 1.5,3.29 1.5,1.79
Mechanical 14:
  circle w0.1: c-0.589,2.459 r0.25
  lines w0.1: -2.5,-3.3 cw(c-2.5,-3.5) -2.3,-3.5 -1.647,-3.5 cw(c-1.448,-3.5) -1.248,-3.5 -0.2,-3.5 cw(c0,-3.5) 0.2,-3.5 1.248,-3.5 cw(c1.448,-3.5) 1.647,-3.5 2.3,-3.5 cw(c2.5,-3.5) 2.5,-3.3 2.5,-2.74 cw(c2.5,-2.54) 2.5,-2.34 2.5,-1.318 cw(c2.5,-1.118) 2.5,-0.918 2.5,-0.2 cw(c2.5,0) 2.5,0.2 2.5,0.918 cw(c2.5,1.118) 2.5,1.318 2.5,2.34 cw(c2.5,2.54) 2.5,2.74 2.5,3.3 cw(c2.5,3.5) 2.3,3.5 1.647,3.5 cw(c1.448,3.5) 1.248,3.5 0.2,3.5 cw(c0,3.5) -0.2,3.5 -1.248,3.5 cw(c-1.448,3.5) -1.647,3.5 -2.3,3.5 cw(c-2.5,3.5) -2.5,3.3 -2.5,2.74 cw(c-2.5,2.54) -2.5,2.34 -2.5,1.318 cw(c-2.5,1.118) -2.5,0.918 -2.5,0.2 cw(c-2.5,0) -2.5,-0.2 -2.5,-0.918 cw(c-2.5,-1.118) -2.5,-1.318 -2.5,-2.34 cw(c-2.5,-2.54) -2.5,-2.74 -2.5,-3.3 ; -1.998,-2.666 -1.448,-2.666 -1.448,-1.616 -1.998,-1.616 -1.998,-2.666 ; -1.998,-0.459 -1.998,0.591 -1.448,0.591 -1.448,-0.459 -1.998,-0.459 ; -1.998,1.684 -1.998,2.734 -1.448,2.734 -1.448,1.684 -1.998,1.684 ; -1.089,-2.441 ccw(c-0.589,-2.441) -0.589,-2.941 1.414,-2.941 ccw(c1.414,-2.441) 1.914,-2.441 1.914,2.459 ccw(c1.414,2.459) 1.414,2.959 -0.589,2.959 ccw(c-0.589,2.459) -1.089,2.459 -1.089,-2.441
Mechanical 15:
  lines w0.1: -2.95,-3.75 2.95,-3.75 2.95,3.75 -2.95,3.75 -2.95,-3.75
3D body "OSC_IQD_CFPT-126.stp": height 2, standoff 0, extent -2.5,-3.5 2.5,3.5

## OSC_IQD_CFPT-141 [mm] "SMD Oscillator, Corner Convave, 4 pins, 5x3.2mm"
height 1.1
pads (4):
  rect 1.1x1.4 smd: 1(-1.15,1.9) 2(-1.15,-1.9) 3(1.15,-1.9) 4(1.15,1.9)
Top Overlay:
  circle w0.25: c-2.4,2.25 r0.125
  lines w0.2: -1.6,-0.9 -1.6,0.9 ; -0.3,-2.5 0.3,-2.5 ; -0.3,2.5 0.3,2.5 ; 1.6,-0.9 1.6,0.9
Mechanical 8:
  lines w0.1: -1.65,-1.9 -1.15,-1.9 ; -1.65,1.9 -1.15,1.9 ; -1.15,-2.4 -1.15,-1.9 ; -1.15,-1.4 -1.15,-1.9 ; -1.15,1.4 -1.15,1.9 ; -1.15,2.4 -1.15,1.9 ; -0.65,-1.9 -1.15,-1.9 ; -0.65,1.9 -1.15,1.9 ; -0.5,0 0,0 ; 0,-0.5 0,0 ; 0,0.5 0,0 ; 0.5,0 0,0 ; 0.65,-1.9 1.15,-1.9 ; 0.65,1.9 1.15,1.9 ; 1.15,-2.4 1.15,-1.9 ; 1.15,-1.4 1.15,-1.9 ; 1.15,1.4 1.15,1.9 ; 1.15,2.4 1.15,1.9 ; 1.65,-1.9 1.15,-1.9 ; 1.65,1.9 1.15,1.9 ; -1.7,-2.6 -1.7,-1.2 -0.6,-1.2 -0.6,-2.6 -1.7,-2.6 ; -1.7,1.2 -1.7,2.6 -0.6,2.6 -0.6,1.2 -1.7,1.2 ; 0.6,-2.6 0.6,-1.2 1.7,-1.2 1.7,-2.6 0.6,-2.6 ; 0.6,1.2 0.6,2.6 1.7,2.6 1.7,1.2 0.6,1.2
Mechanical 14:
  circle w0.1: c-0.55,1.6 r0.5
  lines w0.1: -1.6,-2.35 cw(c-1.6,-2.5) -1.45,-2.5 1.45,-2.5 cw(c1.6,-2.5) 1.6,-2.35 1.6,2.35 cw(c1.6,2.5) 1.45,2.5 -1.45,2.5 cw(c-1.6,2.5) -1.6,2.35 -1.6,-2.35
Mechanical 15:
  lines w0.05: -1.95,-2.85 -1.95,2.85 1.95,2.85 1.95,-2.85 -1.95,-2.85
3D body "OSC_IQD_CFPT-141.stp": height 1.1, standoff 0, extent -1.6,-2.5 1.6,2.5